# Altium footprint library Connectors.PcbLib: 114 footprints (part 6 of 8)
Each footprint in its own frame and in the unit in brackets; x right, y up, seen from the top. Pads: shape width x height; smd on the part's side, far side on the other; paste and mask are expansions set on the pad; w line width, h text height; cw(c..) or ccw(c..) is an arc to the next point about the centre after c.
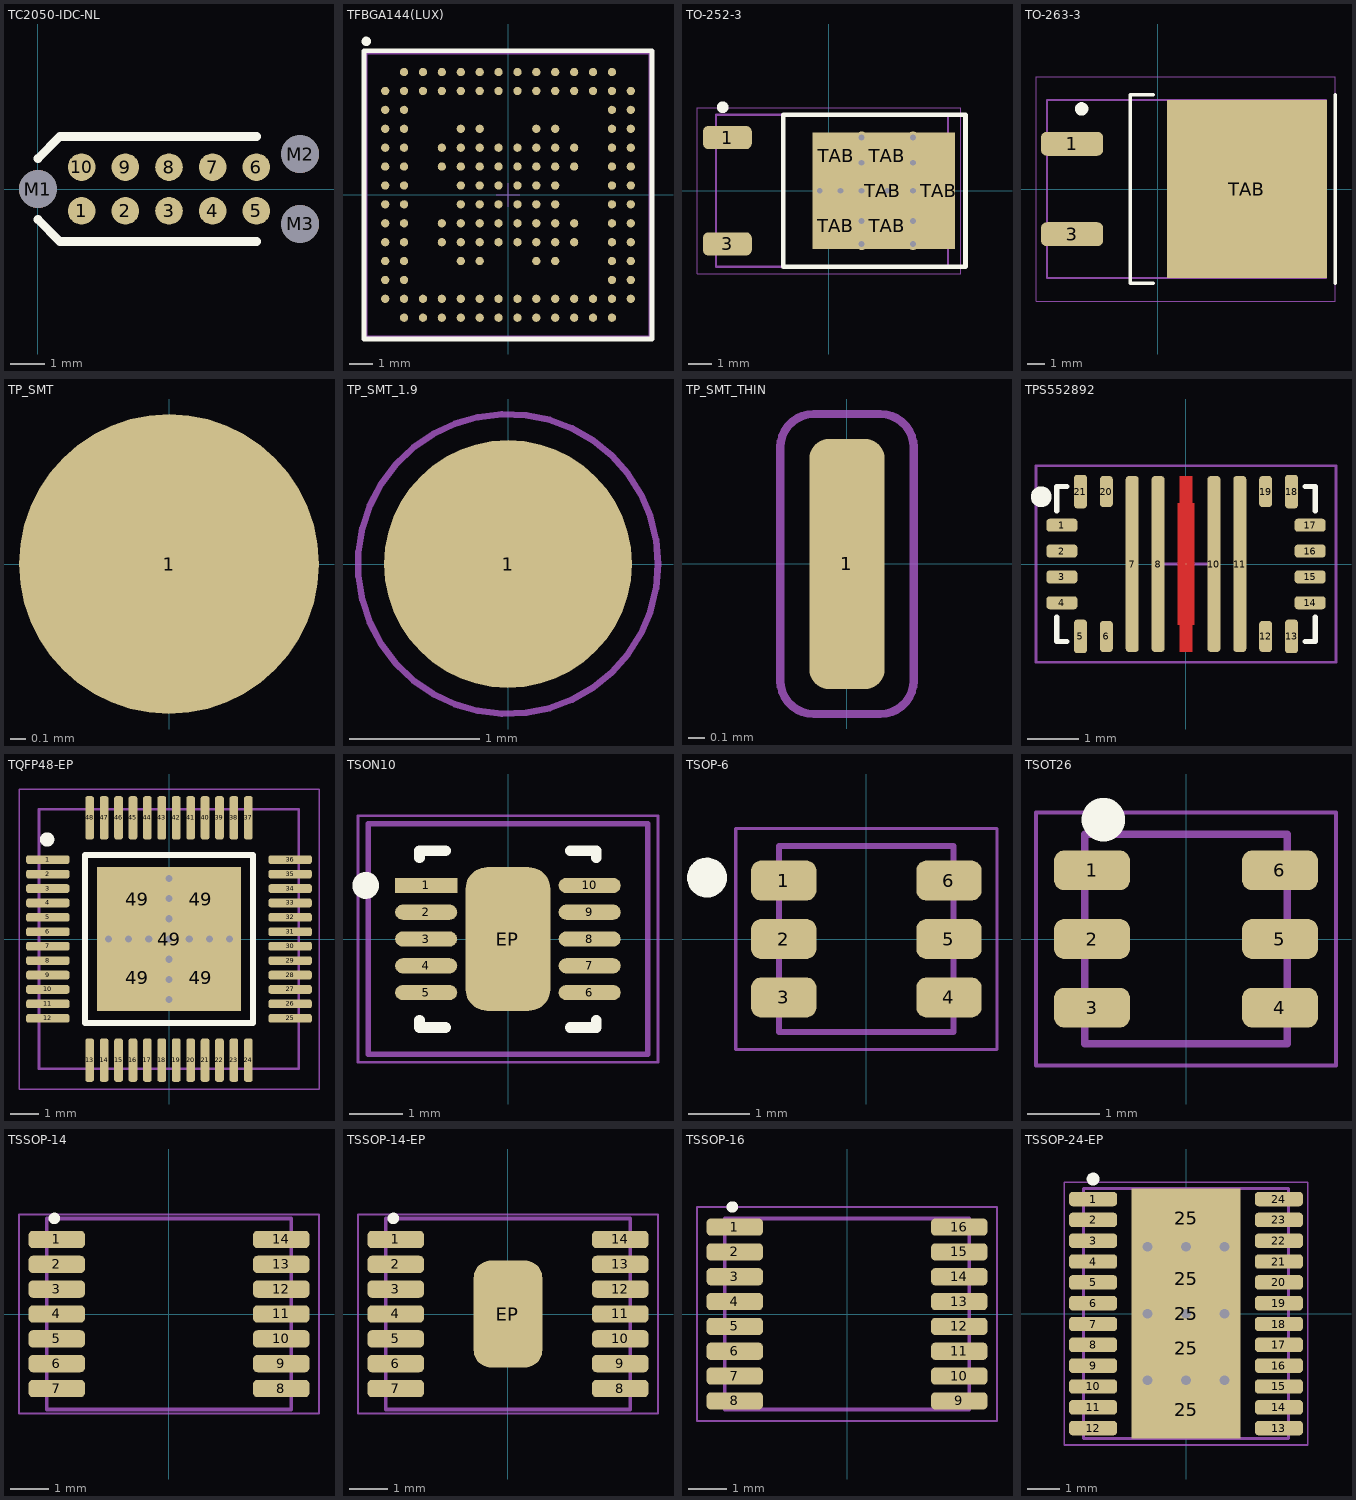
[diagram p5: the footprints below, top view; thin cyan lines are the x and y axes]

## TC2050-IDC-NL [mm]
pads (13):
  round 0.8 smd paste-2539.97: 1(1.27,-0.635) 2(2.54,-0.635) 3(3.81,-0.635) 4(5.08,-0.635) 5(6.35,-0.635) 6(6.35,0.635) 7(5.08,0.635) 8(3.81,0.635) 9(2.54,0.635) 10(1.27,0.635)
  round 1.1 hole 1.1 unplated: M1(0,0) M2(7.62,1.016) M3(7.62,-1.016)
Top Overlay:
  lines w0.254: 0,-0.889 0.635,-1.524 6.35,-1.524 ; 0,0.889 0.635,1.524 6.35,1.524

## TFBGA144(LUX) [mm] "144-Ball Thin Fine-Pitch Ball Grid Array Package (LUX) - 12×12×1.19 mm Body [TFBGA]"
height 1.19
pads (144):
  round 0.35 smd: A2(-4.4,5.2) A3(-3.6,5.2) A4(-2.8,5.2) A5(-2,5.2) A6(-1.2,5.2) A7(-0.4,5.2) A8(0.4,5.2) A9(1.2,5.2) A10(2,5.2) A11(2.8,5.2) A12(3.6,5.2) A13(4.4,5.2) B1(-5.2,4.4) B2(-4.4,4.4) B3(-3.6,4.4) B4(-2.8,4.4) B5(-2,4.4) B6(-1.2,4.4) B7(-0.4,4.4) B8(0.4,4.4) B9(1.2,4.4) B10(2,4.4) B11(2.8,4.4) B12(3.6,4.4) B13(4.4,4.4) B14(5.2,4.4) C1(-5.2,3.6) C2(-4.4,3.6) C13(4.4,3.6) C14(5.2,3.6) D1(-5.2,2.8) D2(-4.4,2.8) D5(-2,2.8) D6(-1.2,2.8) D9(1.2,2.8) D10(2,2.8) D13(4.4,2.8) D14(5.2,2.8) E1(-5.2,2) E2(-4.4,2) E4(-2.8,2) E5(-2,2) E6(-1.2,2) E7(-0.4,2) E8(0.4,2) E9(1.2,2) E10(2,2) E11(2.8,2) E13(4.4,2) E14(5.2,2) F1(-5.2,1.2) F2(-4.4,1.2) F4(-2.8,1.2) F5(-2,1.2) F6(-1.2,1.2) F7(-0.4,1.2) F8(0.4,1.2) F9(1.2,1.2) F10(2,1.2) F11(2.8,1.2) F13(4.4,1.2) F14(5.2,1.2) G1(-5.2,0.4) G2(-4.4,0.4) G5(-2,0.4) G6(-1.2,0.4) G7(-0.4,0.4) G8(0.4,0.4) G9(1.2,0.4) G10(2,0.4) G13(4.4,0.4) G14(5.2,0.4) H1(-5.2,-0.4) H2(-4.4,-0.4) H5(-2,-0.4) H6(-1.2,-0.4) H7(-0.4,-0.4) H8(0.4,-0.4) H9(1.2,-0.4) H10(2,-0.4) H13(4.4,-0.4) H14(5.2,-0.4) J1(-5.2,-1.2) J2(-4.4,-1.2) J4(-2.8,-1.2) J5(-2,-1.2) J6(-1.2,-1.2) J7(-0.4,-1.2) J8(0.4,-1.2) J9(1.2,-1.2) J10(2,-1.2) J11(2.8,-1.2) J13(4.4,-1.2) J14(5.2,-1.2) K1(-5.2,-2) K2(-4.4,-2) K4(-2.8,-2) K5(-2,-2) K6(-1.2,-2) K7(-0.4,-2) K8(0.4,-2) K9(1.2,-2) K10(2,-2) K11(2.8,-2) K13(4.4,-2) K14(5.2,-2) L1(-5.2,-2.8) L2(-4.4,-2.8) L5(-2,-2.8) L6(-1.2,-2.8) L9(1.2,-2.8) L10(2,-2.8) L13(4.4,-2.8) L14(5.2,-2.8) M1(-5.2,-3.6) M2(-4.4,-3.6) M13(4.4,-3.6) M14(5.2,-3.6) N1(-5.2,-4.4) N2(-4.4,-4.4) N3(-3.6,-4.4) N4(-2.8,-4.4) N5(-2,-4.4) N6(-1.2,-4.4) N7(-0.4,-4.4) N8(0.4,-4.4) N9(1.2,-4.4) N10(2,-4.4) N11(2.8,-4.4) N12(3.6,-4.4) N13(4.4,-4.4) N14(5.2,-4.4) P2(-4.4,-5.2) P3(-3.6,-5.2) P4(-2.8,-5.2) P5(-2,-5.2) P6(-1.2,-5.2) P7(-0.4,-5.2) P8(0.4,-5.2) P9(1.2,-5.2) P10(2,-5.2) P11(2.8,-5.2) P12(3.6,-5.2) P13(4.4,-5.2)
Top Overlay:
  circle w0.2: c-6,6.5 r0.1
  lines w0.2: -6.1,-6.1 6.1,-6.1 6.1,6.1 -6.1,6.1 -6.1,-6.1
Mechanical 13:
  lines w0.1: -6,-6 6,-6 6,6 -6,6 -6,-6
Mechanical 15:
  lines w0.05: -0.5,0 0.5,0 ; 0,-0.5 0,0.5 ; -6,-6 6,-6 6,6 -6,6 -6,-6
3D body: height 1.19, standoff 0, extent -6,-6 6,6

## TO-252-3 [mm] "TO-252-3, DPak (2 Leads + Tab), SC-63"
height 2.28
pads (8):
  rrect50% 2.1x1 smd: 1(-4.35,2.28) 3(-4.35,-2.28)
  rect 1.4x2 smd paste-2539.97 mask+0.102: TAB(0.3,-1.5) TAB(0.311,1.501) TAB(2.5,-1.5) TAB(2.5,1.5)
  rect 6x5 smd paste-10 mask+0.102: TAB(2.3,0)
  rect 1.4x5 smd paste-2539.97 mask+0.102: TAB(4.7,0)
via 1.4,0 diameter 0.5 hole 0.25
via 1.4,2.28 diameter 0.5 hole 0.25
via 1.4,-2.28 diameter 0.5 hole 0.25
via 2.5,0 diameter 0.5 hole 0.25
via 3.6,0 diameter 0.5 hole 0.25
via 3.6,2.28 diameter 0.5 hole 0.25
via 3.6,-2.28 diameter 0.5 hole 0.25
via 3.6,-1.3 diameter 0.5 hole 0.25
via 1.4,-1.3 diameter 0.5 hole 0.25
via 1.4,1.2 diameter 0.5 hole 0.25
via 3.6,1.2 diameter 0.5 hole 0.25
via 0.5,0 diameter 0.5 hole 0.25
via -0.389,0 diameter 0.5 hole 0.25
Top Overlay:
  circle w0.25: c-4.55,3.575 r0.125
  lines w0.2: -1.95,-3.25 -1.95,3.25 5.85,3.25 5.85,-3.25 -1.95,-3.25
Top Paste:
  rectangle: -0.614,0.3 1.011,2.416
  rectangle: 1.678,0.3 3.302,2.416
  rectangle: -0.614,-2.416 1.011,-0.3
  rectangle: 1.678,-2.416 3.302,-0.3
  rectangle: 3.9,-2.4 5.3,2.4
Mechanical 13:
  lines w0.1: -4.836,-3.25 -4.836,3.25 5.1,3.25 5.1,-3.25 -4.836,-3.25
Mechanical 15:
  lines w0.05: -5.65,-3.55 -5.65,3.55 5.65,3.55 5.65,-3.55 -5.65,-3.55
3D body "User Library-DPAK-1.step": height 2.34, standoff -0.07, extent -4.836,-3.27 5.102,3.27

## TO-263-3 [mm] "TO-263-3, Dï¿½Pak (2 Leads + Tab), TO-263AB"
height 4.5
pads (3):
  rrect50% 3.5x1.35 smd paste-0.05: 1(-4.825,2.54) 3(-4.825,-2.54)
  rect 9x10 smd paste-2539.97 mask+0.102: TAB(5,0)
Top Overlay:
  circle w0.5: c-4.287,4.5 r0.125
  lines w0.2: -0.275,-5.3 -1.55,-5.3 -1.55,5.3 -0.275,5.3 ; 9.95,-5.3 9.95,5.3
Top Paste:
  rectangle: 7.9,-5 9.4,-3.2
  rectangle: 7.9,-2.3 9.4,-0.5
  rectangle: 7.9,0.5 9.4,2.3
  rectangle: 7.9,3.2 9.4,5
  rectangle: 5.5,-5 7,-3.2
  rectangle: 5.5,-2.3 7,-0.5
  rectangle: 5.5,0.5 7,2.3
  rectangle: 5.5,3.2 7,5
  rectangle: 2.9,-5 4.4,-3.2
  rectangle: 2.9,-2.3 4.4,-0.5
  rectangle: 2.9,0.5 4.4,2.3
  rectangle: 2.9,3.2 4.4,5
  rectangle: 0.5,-5 2,-3.2
  rectangle: 0.5,-2.3 2,-0.5
  rectangle: 0.5,0.5 2,2.3
  rectangle: 0.5,3.2 2,5
Mechanical 13:
  lines w0.1: -6.24,-5 9.45,-5 9.45,5 -6.24,5 -6.24,-5
Mechanical 15:
  lines w0.05: -6.85,-6.3 9.95,-6.3 9.95,6.3 -6.85,6.3 -6.85,-6.3
3D body "User Library-TO263-3S.STEP": height 4.78, standoff -0.02, extent -6.24,-5 9.43,5

## TP_SMT [mm] "Test Point, Surface Mounting, Circular, Pad diameter 1mm"
pads (1):
  round 1.9 smd: 1(0,0)
Mechanical 15:
  circle w0.05: c0,0 r0.65

## TP_SMT_1.9 [mm] "Test Point, Surface Mounting, Circular, Pad diameter 1.9 mm"
pads (1):
  round 1.9 smd: 1(0,0)
Mechanical 15:
  circle w0.05: c0,0 r1.15

## TP_SMT_THIN [mm] "Test Point, Surface Mounting, Square"
pads (1):
  rrect50% 0.45x1.5 smd: 1(0,0)
Mechanical 15:
  lines w0.05: -0.4,-0.7 ccw(c-0.2,-0.7) -0.2,-0.9 0.2,-0.9 ccw(c0.2,-0.7) 0.4,-0.7 0.4,0.7 ccw(c0.2,0.7) 0.2,0.9 -0.2,0.9 ccw(c-0.2,0.7) -0.4,0.7 -0.4,-0.7

## TPS552892 [mm] "PLASTIC QUAD FLATPACK - NO LEAD  / 3 x 5mm, 0.5mm pitch"
height 1
pads (21):
  rrect50% 0.6x0.25 smd: 1(-2.4,0.75) 2(-2.4,0.25) 3(-2.4,-0.25) 4(-2.4,-0.75) 14(2.4,-0.75) 15(2.4,-0.25) 16(2.4,0.25) 17(2.4,0.75)
  rrect50% 0.25x0.65 smd: 5(-2.04,-1.4) 13(2.04,-1.4) 18(2.04,1.4) 21(-2.04,1.4)
  rrect50% 0.25x0.6 smd: 6(-1.54,-1.4) 12(1.54,-1.4) 19(1.54,1.4) 20(-1.54,1.4)
  rrect50% 0.25x3.4 smd paste-2539.97: 7(-1.04,0) 8(-0.54,0) 10(0.54,0) 11(1.04,0)
  round 0.025 smd paste-2539.97: 9(0,0)
Top Layer:
  region: -0.125,-1.7 -0.125,-1.175 -0.162,-1.175 -0.162,1.175 -0.125,1.175 -0.125,1.7 0.125,1.7 0.125,1.175 0.162,1.175 0.162,-1.175 0.125,-1.175 0.125,-1.7
Top Overlay:
  circle w0.2: c-2.8,1.3 r0.1
  lines w0.1: -2.5,-1.026 -2.5,-1.5 -2.301,-1.5 ; -2.5,1.026 -2.5,1.5 -2.301,1.5 ; 2.301,-1.5 2.5,-1.5 2.5,-1.026 ; 2.301,1.5 2.5,1.5 2.5,1.026
Top Paste:
  rectangle: -0.164,-0.5 0.162,0.5
  region: 0.125,1.7 -0.125,1.7 -0.125,0.7 0.125,0.7
  rectangle: -0.125,-1.7 0.125,-0.7
  rectangle: -1.165,-0.5 -0.915,0.5
  rectangle: -0.665,-0.5 -0.415,0.5
  rectangle: 0.915,-0.5 1.165,0.5
  rectangle: 0.415,-0.5 0.665,0.5
  region: 1.165,1.7 0.915,1.7 0.915,0.7 1.165,0.7
  region: 0.665,1.7 0.415,1.7 0.415,0.7 0.665,0.7
  region: -0.415,1.7 -0.665,1.7 -0.665,0.7 -0.415,0.7
  region: -0.915,1.7 -1.165,1.7 -1.165,0.7 -0.915,0.7
  rectangle: -1.165,-1.7 -0.915,-0.7
  rectangle: -0.665,-1.7 -0.415,-0.7
  rectangle: 0.915,-1.7 1.165,-0.7
  rectangle: 0.415,-1.7 0.665,-0.7
Mechanical 15:
  lines w0.05: -0.5,0 0.5,0 ; 0,-0.5 0,0.5 ; -2.9,-1.9 -2.9,1.9 2.9,1.9 2.9,-1.9 -2.9,-1.9
3D body "RYQ0021B.stp": height 1, standoff 0, extent -2.5,-1.5 2.5,1.5

## TQFP48-EP [mm] "TQFP48 (7x7x1 mm exp. pad down 5.0x5.0)"
height 1
pads (53):
  rrect50% 1.5x0.3 smd mask+0.05: 1(-4.2,2.75) 2(-4.2,2.25) 3(-4.2,1.75) 4(-4.2,1.25) 5(-4.2,0.75) 6(-4.2,0.25) 7(-4.2,-0.25) 8(-4.2,-0.75) 9(-4.2,-1.25) 10(-4.2,-1.75) 11(-4.2,-2.25) 12(-4.2,-2.75) 25(4.2,-2.75) 26(4.2,-2.25) 27(4.2,-1.75) 28(4.2,-1.25) 29(4.2,-0.75) 30(4.2,-0.25) 31(4.2,0.25) 32(4.2,0.75) 33(4.2,1.25) 34(4.2,1.75) 35(4.2,2.25) 36(4.2,2.75)
  rrect50% 0.3x1.5 smd mask+0.05: 13(-2.75,-4.2) 14(-2.25,-4.2) 15(-1.75,-4.2) 16(-1.25,-4.2) 17(-0.75,-4.2) 18(-0.25,-4.2) 19(0.25,-4.2) 20(0.75,-4.2) 21(1.25,-4.2) 22(1.75,-4.2) 23(2.25,-4.2) 24(2.75,-4.2) 37(2.75,4.2) 38(2.25,4.2) 39(1.75,4.2) 40(1.25,4.2) 41(0.75,4.2) 42(0.25,4.2) 43(-0.25,4.2) 44(-0.75,4.2) 45(-1.25,4.2) 46(-1.75,4.2) 47(-2.25,4.2) 48(-2.75,4.2)
  rect 1.4x2 smd paste-2539.97 mask+0.102: 49(-1.104,-1.35) 49(-1.104,1.378) 49(1.1,-1.35) 49(1.1,1.378)
  rect 5x5 smd paste-10 mask+0.102: 49(0,0)
via 0,0 diameter 0.5 hole 0.25
via 0,0.7 diameter 0.5 hole 0.25
via 0,1.4 diameter 0.5 hole 0.25
via 0,2.1 diameter 0.5 hole 0.25
via 0,-0.7 diameter 0.5 hole 0.25
via 0,-1.4 diameter 0.5 hole 0.25
via 0,-2.1 diameter 0.5 hole 0.25
via -0.7,0 diameter 0.5 hole 0.25
via -1.4,0 diameter 0.5 hole 0.25
via -2.1,0 diameter 0.5 hole 0.25
via 0.7,0 diameter 0.5 hole 0.25
via 1.4,0 diameter 0.5 hole 0.25
via 2.1,0 diameter 0.5 hole 0.25
Top Overlay:
  circle w0.25: c-4.225,3.45 r0.125
  lines w0.2: -2.915,-2.915 -2.915,2.915 2.915,2.915 2.915,-2.915 -2.915,-2.915
Top Paste:
  rectangle: -1.9,0.3 -0.3,2.4
  rectangle: -1.9,-2.4 -0.3,-0.3
  rectangle: 0.3,0.3 1.9,2.4
  rectangle: 0.3,-2.4 1.9,-0.3
Mechanical 13:
  lines w0.1: -4.5,-4.496 -4.5,4.496 4.496,4.496 4.496,-3.5 4.496,-4.496 -4.5,-4.496
Mechanical 15:
  lines w0.05: -5.2,-5.2 5.2,-5.2 5.2,5.2 -5.2,5.2 -5.2,-5.2
3D body "TQFP48_7X7X1_EP_STM.step": height 1.4, standoff 0.2, extent -4.496,-4.496 4.496,4.496

## TSON10 [mm] "3.3x3.3mm"
height 1.1
pads (11):
  rect 1.16x0.282 smd paste+0 mask+0: 1(-1.527,1)
  rrect100% 1.16x0.282 smd paste+0 mask+0: 2(-1.527,0.5) 3(-1.527,0) 4(-1.527,-0.5) 5(-1.527,-1) 6(1.526,-1) 7(1.526,-0.5) 8(1.526,0) 9(1.526,0.5) 10(1.526,1)
  rrect50% 1.58x2.68 smd paste-1000 mask+0: EP(-0.001,0)
Top Overlay:
  circle w0.25: c-2.657,1 r0.125
  lines w0.2: -1.651,-1.516 -1.651,-1.65 -1.166,-1.65 ; -1.651,1.516 -1.651,1.65 -1.166,1.65 ; 1.164,-1.65 1.649,-1.65 1.649,-1.516 ; 1.164,1.65 1.649,1.65 1.649,1.516
Top Paste:
  rectangle: -0.432,-0.982 0.431,0.981
Mechanical 13:
  lines w0.1: -2.607,-2.15 -2.607,2.15 2.605,2.15 2.605,-2.15 -2.607,-2.15
Mechanical 15:
  lines w0.05: -2.8,-2.3 2.8,-2.3 2.8,2.3 -2.8,2.3 -2.8,-2.3
Top Component Center:
  lines w0.1: -0.501,0 0.499,0 ; -0.001,-0.5 -0.001,0.5
3D body "IC_Infineon_TLS810A1LDV50XUMA1_eec.STEP": height 0.25, standoff 0, extent -2.607,-2.15 2.605,2.15

## TSOP-6 [mm] "plastic, surface-mounted package (TSOP6); 6 leads; 0.95 mm pitch; 2.9 mm x 1.5 mm x 1 mm body"
height 1
pads (6):
  rrect50% 1.062x0.65 smd mask+0.08: 1(-1.344,0.95) 2(-1.344,0) 3(-1.344,-0.95) 4(1.344,-0.95) 5(1.344,0) 6(1.344,0.95)
Top Overlay:
  circle w0.325: c-2.593,0.998 r0.162
Mechanical 13:
  lines w0.1: -1.42,-1.512 -1.42,1.512 1.42,1.512 1.42,-1.512 -1.42,-1.512
Mechanical 15:
  lines w0.05: -2.125,-1.8 -2.125,1.8 2.125,1.8 2.125,-1.8 -2.125,-1.8
3D body "SI3493BDV-T1-E3.stp": height 1, standoff 0, extent -1.42,-1.512 1.42,1.513

## TSOT26 [mm] "IC Package 2.8 x 2.9 x 1.1(mm), 6pin"
height 1.5
pads (6):
  rrect50% 1.05x0.55 smd: 1(-1.3,0.95) 2(-1.3,0) 3(-1.3,-0.95) 4(1.3,-0.95) 5(1.3,0) 6(1.3,0.95)
Top Overlay:
  circle w0.5: c-1.143,1.651 r0.05
Mechanical 13:
  lines w0.1: -1.4,-1.45 1.4,-1.45 1.4,1.45 -1.4,1.45 -1.4,-1.45
Mechanical 15:
  lines w0.05: -2.075,-1.75 2.075,-1.75 2.075,1.75 -2.075,1.75 -2.075,-1.75
3D body "AP62250WU-7.stp": height 1, standoff 0, extent -1.4,-1.45 1.4,1.45

## TSSOP-14 [mm] "14-TSSOP (0.173\", 4.40mm Width)"
height 1.1
pads (14):
  rrect50% 1.475x0.45 smd mask+0.05: 1(-2.938,1.95) 2(-2.938,1.3) 3(-2.938,0.65) 4(-2.938,0) 5(-2.938,-0.65) 6(-2.938,-1.3) 7(-2.938,-1.95) 8(2.938,-1.95) 9(2.938,-1.3) 10(2.938,-0.65) 11(2.938,0) 12(2.938,0.65) 13(2.938,1.3) 14(2.938,1.95)
Top Overlay:
  circle w0.2: c-3,2.5 r0.05
Mechanical 13:
  lines w0.1: -3.2,-2.5 -3.2,2.5 3.2,2.5 3.2,-2.5 -3.2,-2.5
Mechanical 15:
  lines w0.05: -3.925,-2.6 -3.925,2.6 3.925,2.6 3.925,-2.6 -3.925,-2.6
3D body "User Library-TSSOP-14.STEP": height 1.2, standoff 0, extent -3.2,-2.5 3.2,2.5

## TSSOP-14-EP [mm] "14-TSSOP (0.173\", 4.40mm Width)"
height 1.2
pads (15):
  rrect50% 1.475x0.45 smd mask+0.05: 1(-2.938,1.95) 2(-2.938,1.3) 3(-2.938,0.65) 4(-2.938,0) 5(-2.938,-0.65) 6(-2.938,-1.3) 7(-2.938,-1.95) 8(2.938,-1.95) 9(2.938,-1.3) 10(2.938,-0.65) 11(2.938,0) 12(2.938,0.65) 13(2.938,1.3) 14(2.938,1.95)
  rrect50% 1.8x2.8 smd mask+0.05: EP(0,0)
Top Overlay:
  circle w0.2: c-3,2.5 r0.05
Mechanical 13:
  lines w0.1: -3.2,-2.5 -3.2,2.5 3.2,2.5 3.2,-2.5 -3.2,-2.5
Mechanical 15:
  lines w0.05: -3.925,-2.6 -3.925,2.6 3.925,2.6 3.925,-2.6 -3.925,-2.6
3D body "User Library-TSSOP-14.STEP": height 1.2, standoff 0, extent -3.2,-2.5 3.2,2.5

## TSSOP-16 [mm] "16-Pin Ceramic Case, 0.65 mm pin pitch"
height 1
pads (16):
  rrect50% 1.475x0.45 smd mask+0.05: 1(-2.938,2.275) 2(-2.938,1.625) 3(-2.938,0.975) 4(-2.938,0.325) 5(-2.938,-0.325) 6(-2.938,-0.975) 7(-2.938,-1.625) 8(-2.938,-2.275) 9(2.938,-2.275) 10(2.938,-1.625) 11(2.938,-0.975) 12(2.938,-0.325) 13(2.938,0.325) 14(2.938,0.975) 15(2.938,1.625) 16(2.938,2.275)
Top Overlay:
  circle w0.2: c-3,2.8 r0.05
Mechanical 13:
  lines w0.1: -3.2,-2.5 3.2,-2.5 3.2,2.5 -3.2,2.5 -3.2,-2.5
Mechanical 15:
  lines w0.05: -3.925,-2.8 3.925,-2.8 3.925,2.8 -3.925,2.8 -3.925,-2.8
3D body "DRV8847PWR.stp": height 1.2, standoff 0, extent -3.2,-2.5 3.2,2.5

## TSSOP-24-EP [mm] "24-Pin Ceramic Case, 0.65 mm pin pitch"
height 1.2
pads (29):
  rrect50% 1.5x0.45 smd mask+0.05: 1(-2.9,3.575) 2(-2.9,2.925) 3(-2.9,2.275) 4(-2.9,1.625) 5(-2.9,0.975) 6(-2.9,0.325) 7(-2.9,-0.325) 8(-2.9,-0.975) 9(-2.9,-1.625) 10(-2.9,-2.275) 11(-2.9,-2.925) 12(-2.9,-3.575) 13(2.9,-3.575) 14(2.9,-2.925) 15(2.9,-2.275) 16(2.9,-1.625) 17(2.9,-0.975) 18(2.9,-0.325) 19(2.9,0.325) 20(2.9,0.975) 21(2.9,1.625) 22(2.9,2.275) 23(2.9,2.925) 24(2.9,3.575)
  rect 3.4x1 smd paste-2539.97 mask+0.102: 25(0,-2.994) 25(0,2.969)
  rect 3.4x1.2 smd paste-2539.97 mask+0.102: 25(0,-1.088) 25(0,1.088)
  rect 3.4x7.8 smd paste-10 mask+0.102: 25(0,0)
via 0,0 diameter 0.6 hole 0.3
via 1.2,-2.083 diameter 0.6 hole 0.3
via -1.2,-2.083 diameter 0.6 hole 0.3
via 0,-2.083 diameter 0.6 hole 0.3
via 1.2,2.083 diameter 0.6 hole 0.3
via -1.2,2.083 diameter 0.6 hole 0.3
via 0,2.083 diameter 0.6 hole 0.3
via 1.2,0 diameter 0.6 hole 0.3
via -1.2,0 diameter 0.6 hole 0.3
Top Overlay:
  circle w0.3: c-2.9,4.2 r0.05
Top Paste:
  rectangle: -1.5,2.5 1.5,3.7
  rectangle: -1.5,0.5 1.5,1.7
  rectangle: -1.5,-1.6 1.5,-0.4
  rectangle: -1.5,-3.7 1.5,-2.5
Mechanical 13:
  lines w0.1: -3.2,-3.9 3.2,-3.9 3.2,3.9 -3.2,3.9 -3.2,-3.9
Mechanical 15:
  lines w0.05: -3.8,-4.1 3.8,-4.1 3.8,4.1 -3.8,4.1 -3.8,-4.1
3D body "User Library-TSSOP-24.STEP": height 1.2, standoff 0, extent -3.2,-3.9 3.2,3.9